# Altium footprint library Generic Footprint.PcbLib: 160 footprints (part 15 of 20) (continued)
## Symbol_FCC-Logo-3x2mm_Silkscreen [mm] (continued)
1(2.184,1.657) 1(2.184,1.661) 1(2.184,1.664) 1(2.188,0.311) 1(2.188,0.705) 1(2.188,0.709) 1(2.188,0.712) 1(2.188,0.716) 1(2.191,0.039) 1(2.191,0.042) 1(2.191,0.709) 1(2.191,1.793) 1(2.191,1.804) 1(2.191,2.062) 1(2.191,2.065) 1(2.195,0.036) 1(2.195,1.396) 1(2.195,1.399) 1(2.195,1.8) 1(2.195,2.069) 1(2.198,0.447) 1(2.198,0.719) 1(2.198,1.389) 1(2.201,0.444) 1(2.201,0.45) 1(2.201,1.654) 1(2.205,1.396) 1(2.205,1.661) 1(2.205,1.797) 1(2.208,0.716) 1(2.208,0.722) 1(2.208,1.385) 1(2.208,1.389) 1(2.208,1.392) 1(2.208,1.797) 1(2.212,0.308) 1(2.212,0.716) 1(2.212,1.79) 1(2.215,0.447) 1(2.215,0.45) 1(2.215,0.454) 1(2.215,0.719) 1(2.215,0.726) 1(2.215,1.382) 1(2.215,1.385) 1(2.215,1.389) 1(2.215,1.654) 1(2.218,0.042) 1(2.218,0.046) 1(2.218,0.457) 1(2.218,1.651) 1(2.218,1.657) 1(2.218,2.059) 1(2.218,2.062) 1(2.218,2.065) 1(2.222,0.039) 1(2.222,0.049) 1(2.222,0.314) 1(2.222,0.719) 1(2.222,0.722) 1(2.222,1.379) 1(2.222,1.385) 1(2.222,1.647) 1(2.222,2.055) 1(2.225,0.049) 1(2.225,0.308) 1(2.225,0.311) 1(2.225,0.729) 1(2.229,0.049) 1(2.229,0.45) 1(2.229,0.454) 1(2.229,0.457) 1(2.229,0.722) 1(2.229,0.729) 1(2.229,1.375) 1(2.229,1.644) 1(2.229,1.651) 1(2.229,1.654) 1(2.229,1.793) 1(2.232,0.457) 1(2.232,0.461) 1(2.232,0.726) 1(2.232,0.733) 1(2.232,1.372) 1(2.232,1.379) 1(2.232,1.787) 1(2.232,1.793) 1(2.235,0.726) 1(2.235,0.729) 1(2.235,0.736) 1(2.235,1.379) 1(2.239,0.049) 1(2.239,0.311) 1(2.239,0.318) 1(2.239,0.454) 1(2.239,0.457) 1(2.239,0.733) 1(2.239,0.739) 1(2.239,1.375) 1(2.239,1.793) 1(2.239,2.062) 1(2.242,0.042) 1(2.242,0.046) 1(2.242,0.314) 1(2.242,0.461) 1(2.242,0.464) 1(2.242,0.733) 1(2.242,0.736) 1(2.242,1.368) 1(2.242,1.372) 1(2.242,1.375) 1(2.242,1.647) 1(2.242,1.79) 1(2.242,1.793) 1(2.242,2.052) 1(2.242,2.055) 1(2.242,2.059) 1(2.246,1.64) 1(2.246,1.644) 1(2.246,1.647) 1(2.246,1.651) 1(2.246,1.783) 1(2.249,0.736) 1(2.249,0.739) 1(2.249,0.743) 1(2.252,0.457) 1(2.252,0.464) 1(2.252,0.739) 1(2.252,1.365) 1(2.252,1.368) 1(2.252,1.372) 1(2.256,0.314) 1(2.256,0.318) 1(2.256,0.325) 1(2.256,0.746) 1(2.256,0.75) 1(2.256,1.637) 1(2.256,1.64) 1(2.256,1.79) 1(2.256,2.059) 1(2.259,0.046) 1(2.259,1.362) 1(2.259,1.365) 1(2.259,1.368) 1(2.259,1.644) 1(2.259,1.78) 1(2.259,1.783) 1(2.259,1.787) 1(2.259,2.052) 1(2.263,0.461) 1(2.263,0.753) 1(2.263,1.355) 1(2.263,1.358) 1(2.263,1.362) 1(2.263,1.365) 1(2.263,2.048) 1(2.266,1.358) 1(2.266,1.634) 1(2.266,1.637) 1(2.266,2.055) 1(2.269,0.318) 1(2.269,0.321) 1(2.269,0.325) 1(2.269,0.328) 1(2.269,0.756) 1(2.269,1.351) 1(2.269,1.358) 1(2.269,1.362) 1(2.273,0.756) 1(2.273,0.76) 1(2.273,1.348) 1(2.273,1.634) 1(2.273,1.64) 1(2.273,1.776) 1(2.273,1.78) 1(2.273,1.783) 1(2.273,1.787) 1(2.276,0.464) 1(2.28,0.049) 1(2.28,0.756) 1(2.28,2.045) 1(2.28,2.048) 1(2.283,0.325) 1(2.283,0.328) 1(2.283,0.331) 1(2.283,0.467) 1(2.283,0.76) 1(2.283,0.767) 1(2.283,1.345) 1(2.283,1.637) 1(2.283,2.045) 1(2.286,0.478) 1(2.286,0.76) 1(2.286,0.763) 1(2.286,0.767) 1(2.286,0.77) 1(2.286,1.338) 1(2.286,1.341) 1(2.286,1.773) 1(2.286,1.776) 1(2.286,1.78) 1(2.29,0.328) 1(2.29,0.471) 1(2.29,0.767) 1(2.29,0.77) 1(2.29,0.773) 1(2.29,1.341) 1(2.29,2.045) 1(2.29,2.052) 1(2.293,0.053) 1(2.293,0.059) 1(2.293,0.335) 1(2.293,0.474) 1(2.293,0.478) 1(2.293,0.481) 1(2.293,0.777) 1(2.293,1.334) 1(2.293,1.338) 1(2.293,2.045) 1(2.297,0.77) 1(2.297,1.341) 1(2.297,1.623) 1(2.297,1.63) 1(2.297,1.634) 1(2.297,1.77) 1(2.297,1.773) 1(2.297,1.776) 1(2.3,0.78) 1(2.3,1.331) 1(2.3,1.334) 1(2.3,1.338) 1(2.303,0.338) 1(2.303,0.478) 1(2.303,0.484) 1(2.303,0.784) 1(2.303,1.328) 1(2.303,1.331) 1(2.303,1.334) 1(2.303,1.62) 1(2.303,1.623) 1(2.303,1.627) 1(2.307,0.059) 1(2.307,0.481) 1(2.307,0.784) 1(2.307,0.787) 1(2.307,1.321) 1(2.307,1.324) 1(2.307,1.328) 1(2.307,1.331) 1(2.307,1.763) 1(2.307,1.766) 1(2.307,1.773) 1(2.31,0.056) 1(2.31,0.063) 1(2.31,0.066) 1(2.31,0.787) 1(2.31,0.79) 1(2.31,1.328) 1(2.31,1.617) 1(2.31,1.62) 1(2.31,2.048) 1(2.314,0.342) 1(2.314,0.481) 1(2.314,0.484) 1(2.314,0.488) 1(2.314,0.784) 1(2.314,0.794) 1(2.314,1.317) 1(2.314,1.613) 1(2.314,1.623) 1(2.317,0.338) 1(2.317,0.488) 1(2.317,0.787) 1(2.317,0.79) 1(2.317,0.794) 1(2.317,0.797) 1(2.317,1.314) 1(2.32,0.059) 1(2.32,0.338) 1(2.32,0.79) 1(2.32,0.797) 1(2.32,0.801) 1(2.32,1.311) 1(2.32,1.314) 1(2.32,1.317) 1(2.32,1.62) 1(2.32,1.759) 1(2.32,2.045) 1(2.324,0.063) 1(2.324,0.066) 1(2.324,0.07) 1(2.324,0.345) 1(2.324,0.484) 1(2.324,0.495) 1(2.324,0.794) 1(2.324,0.797) 1(2.324,0.801) 1(2.324,0.804) 1(2.324,1.307) 1(2.324,1.311) 1(2.324,1.317) 1(2.324,1.61) 1(2.324,1.613) 1(2.324,1.617) 1(2.324,2.035) 1(2.327,0.063) 1(2.327,0.066) 1(2.327,0.342) 1(2.327,0.488) 1(2.327,0.495) 1(2.327,0.807) 1(2.327,1.3) 1(2.327,1.304) 1(2.327,1.311) 1(2.327,1.314) 1(2.327,1.613) 1(2.327,1.756) 1(2.327,1.763) 1(2.327,2.042) 1(2.331,0.066) 1(2.331,0.801) 1(2.331,0.804) 1(2.331,0.807) 1(2.331,0.811) 1(2.331,0.814) 1(2.331,1.304) 1(2.331,1.307) 1(2.331,1.606) 1(2.331,1.61) 1(2.331,1.617) 1(2.331,1.763) 1(2.334,0.063) 1(2.334,0.491) 1(2.334,0.804) 1(2.334,0.807) 1(2.334,0.811) 1(2.334,0.818) 1(2.334,1.297) 1(2.334,1.3) 1(2.334,1.307) 1(2.337,0.063) 1(2.337,0.07) 1(2.337,0.342) 1(2.337,0.345) 1(2.337,0.348) 1(2.337,0.811) 1(2.337,0.814) 1(2.337,0.818) 1(2.337,0.821) 1(2.337,1.287) 1(2.337,1.29) 1(2.337,1.294) 1(2.337,1.3) 1(2.337,1.304) 1(2.337,1.603) 1(2.337,1.753) 1(2.337,1.759) 1(2.337,2.031) 1(2.337,2.035) 1(2.337,2.038) 1(2.341,0.066) 1(2.341,0.073) 1(2.341,0.495) 1(2.341,0.501) 1(2.341,0.814) 1(2.341,0.818) 1(2.341,0.821) 1(2.341,0.824) 1(2.341,1.283) 1(2.341,1.606) 1(2.344,0.345) 1(2.344,0.348) 1(2.344,0.352) 1(2.344,1.603) 1(2.344,1.61) 1(2.344,1.756) 1(2.344,1.759) 1(2.348,0.073) 1(2.348,0.076) 1(2.348,0.498) 1(2.348,0.501) 1(2.348,0.505) 1(2.348,1.28) 1(2.348,1.283) 1(2.348,2.028) 1(2.348,2.031) 1(2.348,2.035) 1(2.351,0.07) 1(2.351,0.348) 1(2.351,0.355) 1(2.351,0.508) 1(2.351,1.606) 1(2.351,1.749) 1(2.354,0.352) 1(2.354,0.355) 1(2.354,0.359) 1(2.354,0.501) 1(2.354,0.508) 1(2.354,1.266) 1(2.354,1.27) 1(2.354,1.283) 1(2.354,1.746) 1(2.354,1.753) 1(2.354,1.756) 1(2.358,0.355) 1(2.358,0.505) 1(2.358,0.512) 1(2.358,1.27) 1(2.358,1.277) 1(2.358,1.603) 1(2.358,1.749) 1(2.361,0.352) 1(2.361,0.362) 1(2.361,1.593) 1(2.361,1.742) 1(2.361,1.746) 1(2.361,1.753) 1(2.365,0.073) 1(2.365,0.076) 1(2.365,0.505) 1(2.365,0.508) 1(2.365,0.512) 1(2.365,0.515) 1(2.365,1.273) 1(2.365,1.589) 1(2.365,1.593) 1(2.365,1.596) 1(2.365,1.6) 1(2.365,1.749) 1(2.365,2.025) 1(2.365,2.028) 1(2.365,2.031) 1(2.368,0.073) 1(2.368,2.021) 1(2.371,0.073) 1(2.371,0.365) 1(2.371,0.515) 1(2.371,0.518) 1(2.371,1.586) 1(2.371,1.589) 1(2.371,1.593) 1(2.371,1.739) 1(2.371,1.742) 1(2.371,1.746) 1(2.375,0.512) 1(2.375,2.021) 1(2.375,2.025) 1(2.375,2.028) 1(2.378,0.362) 1(2.378,0.369) 1(2.378,0.518) 1(2.378,0.522) 1(2.378,1.583) 1(2.378,1.586) 1(2.378,1.589) 1(2.378,1.736) 1(2.378,1.742) 1(2.378,2.018) 1(2.382,0.362) 1(2.382,0.515) 1(2.382,0.522) 1(2.382,1.583) 1(2.382,1.586) 1(2.385,0.076) 1(2.385,0.365) 1(2.385,0.372) 1(2.385,1.576) 1(2.385,2.018) 1(2.385,2.025) 1(2.388,0.08) 1(2.388,0.518) 1(2.388,1.576) 1(2.388,1.583) 1(2.388,1.732) 1(2.392,0.365) 1(2.392,0.369) 1(2.392,0.372) 1(2.392,0.376) 1(2.392,0.522) 1(2.392,0.532) 1(2.392,1.572) 1(2.392,1.729) 1(2.392,2.014) 1(2.395,0.525) 1(2.395,1.579) 1(2.395,2.014) 1(2.395,2.021) 1(2.399,0.083) 1(2.399,0.09) 1(2.399,0.369) 1(2.399,0.376) 1(2.399,0.532) 1(2.399,1.572) 1(2.399,1.725) 1(2.402,0.372) 1(2.402,0.379) 1(2.402,0.529) 1(2.402,0.535) 1(2.402,1.569) 1(2.402,1.576) 1(2.405,0.093) 1(2.405,0.539) 1(2.405,1.566) 1(2.405,1.569) 1(2.405,1.722) 1(2.405,1.729) 1(2.409,0.087) 1(2.409,0.09) 1(2.409,0.376) 1(2.409,0.379) 1(2.409,0.382) 1(2.409,0.532) 1(2.409,0.535) 1(2.409,0.542) 1(2.409,1.566) 1(2.409,1.569) 1(2.409,1.572) 1(2.409,1.725) 1(2.409,1.729) 1(2.409,2.018) 1(2.412,0.535) 1(2.412,0.539) 1(2.412,0.546) 1(2.412,1.559) 1(2.412,1.719) 1(2.416,0.379) 1(2.416,0.382) 1(2.416,0.386) 1(2.416,0.539) 1(2.416,0.542) 1(2.416,0.546) 1(2.416,0.549) 1(2.416,1.722) 1(2.416,1.725) 1(2.416,2.004) 1(2.416,2.008) 1(2.416,2.014) 1(2.419,0.09) 1(2.419,0.093) 1(2.419,0.097) 1(2.419,1.555) 1(2.419,1.559) 1(2.419,1.562) 1(2.419,1.566) 1(2.422,0.1) 1(2.422,0.382) 1(2.422,0.386) 1(2.422,0.389) 1(2.422,0.393) 1(2.422,0.542) 1(2.422,0.549) 1(2.422,1.552) 1(2.422,1.555) 1(2.422,1.712) 1(2.422,1.719) 1(2.422,1.722) 1(2.426,0.093) 1(2.426,0.097) 1(2.426,0.386) 1(2.426,0.546) 1(2.426,0.552) 1(2.426,1.552) 1(2.426,1.559) 1(2.426,2.004) 1(2.426,2.008) 1(2.426,2.011) 1(2.429,0.1) 1(2.429,0.104) 1(2.429,0.552) 1(2.429,1.549) 1(2.429,1.555) 1(2.429,1.708) 1(2.429,1.712) 1(2.429,1.719) 1(2.429,2.001) 1(2.433,0.396) 1(2.433,0.549) 1(2.433,0.556) 1(2.433,1.549) 1(2.433,1.715) 1(2.433,2.008) 1(2.436,0.097) 1(2.436,0.104) 1(2.436,0.399) 1(2.436,0.552) 1(2.436,0.556) 1(2.436,0.559) 1(2.436,0.563) 1(2.436,1.552) 1(2.436,2.001) 1(2.439,0.107) 1(2.439,0.556) 1(2.439,0.559) 1(2.439,0.563) 1(2.439,0.566) 1(2.439,1.549) 1(2.439,1.705) 1(2.439,1.712) 1(2.439,1.997) 1(2.439,2.004) 1(2.443,0.1) 1(2.443,0.396) 1(2.443,0.559) 1(2.443,1.545) 1(2.443,1.702) 1(2.446,0.107) 1(2.446,0.399) 1(2.446,0.403) 1(2.446,0.563) 1(2.446,0.566) 1(2.446,0.569) 1(2.446,1.698) 1(2.446,1.994) 1(2.446,1.997) 1(2.446,2.001) 1(2.45,0.11) 1(2.45,0.396) 1(2.45,0.399) 1(2.45,0.406) 1(2.45,1.532) 1(2.45,1.535) 1(2.45,1.542) 1(2.453,0.403) 1(2.453,0.406) 1(2.453,0.41) 1(2.453,0.566) 1(2.453,0.569) 1(2.453,0.573) 1(2.453,1.528) 1(2.453,1.532) 1(2.453,1.535) 1(2.453,1.538) 1(2.456,0.104) 1(2.456,0.11) 1(2.456,0.569) 1(2.456,0.573) 1(2.456,1.528) 1(2.456,1.535) 1(2.456,1.691) 1(2.456,1.695) 1(2.456,1.698) 1(2.456,1.991) 1(2.456,1.994) 1(2.46,0.403) 1(2.46,0.406) 1(2.46,0.41) 1(2.46,0.413) 1(2.46,0.573) 1(2.46,1.521) 1(2.46,1.532) 1(2.46,1.695) 1(2.46,1.698) 1(2.46,1.997) 1(2.463,0.107) 1(2.463,0.576) 1(2.463,1.528) 1(2.463,1.991) 1(2.467,1.518) 1(2.467,1.688) 1(2.467,1.695) 1(2.47,0.11) 1(2.47,0.41) 1(2.47,0.413) 1(2.47,0.416) 1(2.47,0.42) 1(2.47,0.58) 1(2.47,1.518) 1(2.47,1.521) 1(2.47,1.525) 1(2.47,1.685) 1(2.47,1.688) 1(2.47,1.691) 1(2.47,1.994) 1(2.473,0.114) 1(2.473,0.121) 1(2.473,0.413) 1(2.473,0.416) 1(2.473,0.583) 1(2.473,1.521) 1(2.473,1.691) 1(2.473,1.991) 1(2.477,0.416) 1(2.477,0.423) 1(2.477,0.586) 1(2.477,1.518) 1(2.477,1.681) 1(2.477,1.688) 1(2.48,0.427) 1(2.48,0.597) 1(2.48,1.504) 1(2.48,1.508) 1(2.48,1.678) 1(2.484,0.117) 1(2.484,0.121) 1(2.484,0.124) 1(2.484,0.43) 1(2.484,0.59) 1(2.484,0.593) 1(2.484,0.597) 1(2.484,0.6) 1(2.484,1.501) 1(2.484,1.508) 1(2.484,1.511) 1(2.484,1.515) 1(2.484,1.674) 1(2.484,1.98) 1(2.484,1.987) 1(2.487,0.597) 1(2.487,0.6) 1(2.487,0.603) 1(2.487,1.498) 1(2.487,1.504) 1(2.487,1.508) 1(2.487,1.98) 1(2.49,0.121) 1(2.49,0.124) 1(2.49,0.127) 1(2.49,0.427) 1(2.49,0.433) 1(2.49,0.6) 1(2.49,0.603) 1(2.49,0.607) 1(2.49,1.494) 1(2.49,1.498) 1(2.49,1.501) 1(2.49,1.504) 1(2.49,1.671) 1(2.49,1.977) 1(2.49,1.984) 1(2.494,0.427) 1(2.494,0.43) 1(2.494,0.437) 1(2.494,0.603) 1(2.494,0.607) 1(2.494,0.821) 1(2.494,0.824) 1(2.494,0.828) 1(2.494,1.491) 1(2.494,1.494) 1(2.494,1.501) 1(2.494,1.668) 1(2.497,0.124) 1(2.497,0.127) 1(2.497,0.131) 1(2.497,0.43) 1(2.497,0.433) 1(2.497,1.487) 1(2.497,1.491) 1(2.497,1.498) 1(2.497,1.974) 1(2.497,1.977) 1(2.497,1.98) 1(2.501,0.134) 1(2.501,0.437) 1(2.501,0.44) 1(2.501,0.607) 1(2.501,0.61) 1(2.501,1.487) 1(2.501,1.494) 1(2.501,1.664) 1(2.501,1.97) 1(2.504,0.127) 1(2.504,0.134) 1(2.504,0.433) 1(2.504,0.437) 1(2.504,0.444) 1(2.504,0.614) 1(2.504,0.62) 1(2.504,1.491) 1(2.504,1.661) 1(2.504,1.977) 1(2.507,0.131) 1(2.507,0.138) 1(2.507,0.44) 1(2.507,0.447) 1(2.507,0.617) 1(2.507,0.62) 1(2.507,0.624) 1(2.507,1.477) 1(2.507,1.487) 1(2.507,1.657) 1(2.507,1.661) 1(2.507,1.664) 1(2.507,1.967) 1(2.507,1.97) 1(2.507,1.974) 1(2.511,0.131) 1(2.511,0.44) 1(2.511,0.444) 1(2.511,0.62) 1(2.511,0.624) 1(2.511,0.627) 1(2.511,0.631) 1(2.511,1.474) 1(2.511,1.484) 1(2.511,1.664) 1(2.511,1.974) 1(2.514,0.138) 1(2.514,0.141) 1(2.514,0.45) 1(2.514,0.627) 1(2.514,1.47) 1(2.514,1.477) 1(2.514,1.481) 1(2.514,1.654) 1(2.514,1.657) 1(2.514,1.661) 1(2.514,1.963) 1(2.514,1.967) 1(2.514,1.97) 1(2.518,0.134) 1(2.518,0.141) 1(2.518,0.444) 1(2.518,0.447) 1(2.518,0.624) 1(2.518,0.627) 1(2.518,0.631) 1(2.518,0.634) 1(2.518,0.637) 1(2.518,1.467) 1(2.518,1.474) 1(2.518,1.477) 1(2.518,1.651) 1(2.521,0.447) 1(2.521,0.454) 1(2.521,0.631) 1(2.521,0.634) 1(2.521,1.464) 1(2.521,1.47) 1(2.521,1.474) 1(2.521,1.647) 1(2.521,1.654) 1(2.521,1.657) 1(2.521,1.96) 1(2.521,1.963) 1(2.524,0.457) 1(2.524,0.461) 1(2.524,0.634) 1(2.524,0.637) 1(2.524,0.641) 1(2.524,0.644) 1(2.524,1.464) 1(2.524,1.467) 1(2.524,1.47) 1(2.524,1.644) 1(2.524,1.654) 1(2.524,1.967) 1(2.528,0.138) 1(2.528,0.457) 1(2.528,0.637) 1(2.528,0.641) 1(2.528,0.644) 1(2.528,1.467) 1(2.528,1.96) 1(2.531,0.464) 1(2.531,1.464) 1(2.531,1.64) 1(2.535,0.141) 1(2.535,0.148) 1(2.535,0.151) 1(2.535,0.457) 1(2.535,0.641) 1(2.535,0.644) 1(2.535,0.648) 1(2.535,0.654) 1(2.535,1.46) 1(2.535,1.637) 1(2.535,1.963) 1(2.538,0.467) 1(2.538,0.651) 1(2.538,0.654) 1(2.538,0.658) 1(2.538,0.661) 1(2.538,1.447) 1(2.538,1.453) 1(2.538,1.457) 1(2.538,1.634) 1(2.538,1.64) 1(2.541,0.144) 1(2.541,0.148) 1(2.541,0.151) 1(2.541,0.155) 1(2.541,0.467) 1(2.541,0.471) 1(2.541,0.654) 1(2.541,0.658) 1(2.541,0.665) 1(2.541,0.668) 1(2.541,1.436) 1(2.541,1.44) 1(2.541,1.447) 1(2.541,1.45) 1(2.541,1.637) 1(2.541,1.64) 1(2.541,1.96) 1(2.545,0.148) 1(2.545,0.467) 1(2.545,0.471) 1(2.545,0.474) 1(2.545,0.478) 1(2.545,0.658) 1(2.545,0.661) 1(2.545,0.665) 1(2.545,0.671) 1(2.545,1.44) 1(2.545,1.447) 1(2.545,1.63) 1(2.545,1.95) 1(2.545,1.957) 1(2.548,0.155) 1(2.548,0.471) 1(2.548,0.481) 1(2.548,0.661) 1(2.548,1.433) 1(2.548,1.443) 1(2.548,1.63) 1(2.548,1.637) 1(2.548,1.95) 1(2.552,0.151) 1(2.552,0.158) 1(2.552,0.665) 1(2.552,0.671) 1(2.552,0.675) 1(2.552,1.433) 1(2.552,1.44) 1(2.552,1.623) 1(2.552,1.627) 1(2.552,1.946) 1(2.552,1.953) 1(2.555,0.671) 1(2.555,0.675) 1(2.555,0.678) 1(2.555,0.682) 1(2.555,1.423) 1(2.555,1.433) 1(2.555,1.627) 1(2.555,1.63) 1(2.555,1.943) 1(2.555,1.946) 1(2.558,0.155) 1(2.558,0.158) 1(2.558,0.161) 1(2.558,0.484) 1(2.558,0.675) 1(2.558,0.678) 1(2.558,0.682) 1(2.558,1.423) 1(2.558,1.43) 1(2.558,1.62) 1(2.558,1.623) 1(2.558,1.627) 1(2.558,1.94) 1(2.558,1.943) 1(2.558,1.946) 1(2.558,1.95) 1(2.562,0.488) 1(2.562,0.678) 1(2.562,0.682) 1(2.562,0.685) 1(2.562,0.692) 1(2.562,1.413) 1(2.562,1.419) 1(2.562,1.423) 1(2.562,1.426) 1(2.562,1.613) 1(2.562,1.617) 1(2.562,1.62) 1(2.562,1.623) 1(2.562,1.936) 1(2.565,0.158) 1(2.565,0.161) 1(2.565,0.165) 1(2.565,0.491) 1(2.565,1.409) 1(2.565,1.61) 1(2.565,1.617) 1(2.565,1.62) 1(2.569,0.161) 1(2.569,0.165) 1(2.569,0.488) 1(2.569,0.491) 1(2.569,0.495) 1(2.569,0.688) 1(2.569,0.692) 1(2.569,0.699) 1(2.569,0.702) 1(2.569,1.406) 1(2.569,1.409) 1(2.569,1.413) 1(2.569,1.416) 1(2.569,1.606) 1(2.569,1.613) 1(2.569,1.617) 1(2.569,1.933) 1(2.569,1.94) 1(2.569,1.943) 1(2.572,0.488) 1(2.572,0.491) 1(2.572,0.495) 1(2.572,0.498) 1(2.572,0.692) 1(2.572,0.699) 1(2.572,0.705) 1(2.572,0.709) 1(2.572,1.396) 1(2.572,1.399) 1(2.572,1.402) 1(2.572,1.406) 1(2.572,1.413) 1(2.572,1.603) 1(2.572,1.61) 1(2.572,1.613) 1(2.572,1.936) 1(2.575,0.495) 1(2.575,0.498) 1(2.575,0.501) 1(2.575,0.695) 1(2.575,0.699) 1(2.575,0.702) 1(2.575,0.705) 1(2.575,0.709) 1(2.575,0.712) 1(2.575,1.392) 1(2.575,1.396) 1(2.575,1.399) 1(2.575,1.406) 1(2.575,1.409) 1(2.575,1.606) 1(2.575,1.61) 1(2.575,1.933) 1(2.575,1.94) 1(2.579,0.165) 1(2.579,0.498) 1(2.579,0.505) 1(2.579,0.702) 1(2.579,0.705) 1(2.579,0.709) 1(2.579,0.712) 1(2.579,0.716) 1(2.579,0.719) 1(2.579,1.385) 1(2.579,1.389) 1(2.579,1.396) 1(2.579,1.399) 1(2.579,1.6) 1(2.579,1.603) 1(2.579,1.606) 1(2.579,1.929) 1(2.579,1.936) 1(2.582,0.168) 1(2.582,0.508) 1(2.582,0.712) 1(2.582,1.593) 1(2.582,1.596) 1(2.582,1.6) 1(2.582,1.603) 1(2.582,1.929) 1(2.586,0.175) 1(2.586,0.512) 1(2.586,0.716) 1(2.586,0.719) 1(2.586,0.722) 1(2.586,0.726) 1(2.586,1.379) 1(2.586,1.382) 1(2.586,1.385) 1(2.586,1.589) 1(2.586,1.596) 1(2.586,1.6) 1(2.586,1.933) 1(2.589,0.172) 1(2.589,0.175) 1(2.589,0.178) 1(2.589,0.512) 1(2.589,0.515) 1(2.589,0.716) 1(2.589,0.719) 1(2.589,0.722) 1(2.589,0.726) 1(2.589,0.729) 1(2.589,1.372) 1(2.589,1.375) 1(2.589,1.379) 1(2.589,1.385) 1(2.589,1.593) 1(2.589,1.596) 1(2.592,0.175) 1(2.592,0.178) 1(2.592,0.182) 1(2.592,0.512) 1(2.592,0.515) 1(2.592,0.518) 1(2.592,0.722) 1(2.592,0.726) 1(2.592,1.372) 1(2.592,1.375) 1(2.592,1.586) 1(2.592,1.589) 1(2.592,1.593) 1(2.592,1.929) 1(2.596,0.185) 1(2.596,0.515) 1(2.596,0.518) 1(2.596,0.522) 1(2.596,0.75) 1(2.596,0.753) 1(2.596,1.372) 1(2.596,1.375) 1(2.596,1.379) 1(2.596,1.579) 1(2.596,1.583) 1(2.596,1.586) 1(2.596,1.589) 1(2.596,1.926) 1(2.599,0.522) 1(2.599,0.525) 1(2.599,0.733) 1(2.599,0.739) 1(2.599,1.351) 1(2.599,1.355) 1(2.599,1.365) 1(2.599,1.576) 1(2.599,1.583) 1(2.599,1.586) 1(2.599,1.916) 1(2.603,0.178) 1(2.603,0.182) 1(2.603,0.185) 1(2.603,0.189) 1(2.603,0.518) 1(2.603,0.525) 1(2.603,0.529) 1(2.603,0.736) 1(2.603,0.756) 1(2.603,1.348) 1(2.603,1.358) 1(2.603,1.368) 1(2.603,1.572) 1(2.603,1.579) 1(2.603,1.583) 1(2.603,1.923) 1(2.606,0.182) 1(2.606,0.189) 1(2.606,0.192) 1(2.606,0.522) 1(2.606,0.525) 1(2.606,0.529) 1(2.606,0.532) 1(2.606,0.743) 1(2.606,0.746) 1(2.606,0.76) 1(2.606,0.763) 1(2.606,1.338) 1(2.606,1.341) 1(2.606,1.345) 1(2.606,1.351) 1(2.606,1.362) 1(2.606,1.569) 1(2.606,1.576) 1(2.606,1.579) 1(2.606,1.912) 1(2.606,1.916) 1(2.606,1.919) 1(2.609,0.185) 1(2.609,0.529) 1(2.609,0.532) 1(2.609,0.535) 1(2.609,0.76) 1(2.609,0.763) 1(2.609,0.767) 1(2.609,0.77) 1(2.609,1.334) 1(2.609,1.341) 1(2.609,1.345) 1(2.609,1.351) 1(2.609,1.572) 1(2.609,1.576) 1(2.613,0.192) 1(2.613,0.195) 1(2.613,0.532) 1(2.613,0.539) 1(2.613,0.76) 1(2.613,0.763) 1(2.613,0.77) 1(2.613,0.777) 1(2.613,1.328) 1(2.613,1.334) 1(2.613,1.341) 1(2.613,1.345) 1(2.613,1.566) 1(2.613,1.569) 1(2.613,1.572) 1(2.613,1.909) 1(2.613,1.912) 1(2.613,1.916) 1(2.616,0.189) 1(2.616,0.542) 1(2.616,0.773) 1(2.616,0.777) 1(2.616,1.328) 1(2.616,1.331) 1(2.616,1.559) 1(2.616,1.562) 1(2.616,1.569) 1(2.616,1.906) 1(2.616,1.909) 1(2.616,1.912) 1(2.62,0.195) 1(2.62,0.546) 1(2.62,0.77) 1(2.62,1.334) 1(2.62,1.555) 1(2.62,1.562) 1(2.62,1.902) 1(2.623,0.192) 1(2.623,0.546) 1(2.623,0.549) 1(2.623,0.777) 1(2.623,0.78) 1(2.623,0.801) 1(2.623,0.804) 1(2.623,1.304) 1(2.623,1.321) 1(2.623,1.324) 1(2.623,1.328) 1(2.623,1.552) 1(2.623,1.559) 1(2.623,1.562) 1(2.623,1.906) 1(2.626,0.546) 1(2.626,0.549) 1(2.626,0.552) 1(2.626,0.784) 1(2.626,0.787) 1(2.626,0.79) 1(2.626,0.801) 1(2.626,0.804) 1(2.626,0.811) 1(2.626,1.294) 1(2.626,1.304) 1(2.626,1.317) 1(2.626,1.555) 1(2.626,1.559) 1(2.626,1.902) 1(2.626,1.906) 1(2.626,1.909) 1(2.63,0.195) 1(2.63,0.563) 1(2.63,0.794) 1(2.63,0.797) 1(2.63,0.801) 1(2.63,0.811) 1(2.63,0.814) 1(2.63,0.818) 1(2.63,1.28) 1(2.63,1.283) 1(2.63,1.287) 1(2.63,1.294) 1(2.63,1.304) 1(2.63,1.307) 1(2.63,1.311) 1(2.63,1.314) 1(2.63,1.549) 1(2.63,1.552) 1(2.63,1.555) 1(2.633,0.199) 1(2.633,0.549) 1(2.633,0.556) 1(2.633,0.559) 1(2.633,0.566) 1(2.633,0.804) 1(2.633,0.807) 1(2.633,0.821) 1(2.633,1.29) 1(2.633,1.297) 1(2.633,1.3) 1(2.633,1.545) 1(2.633,1.552) 1(2.637,0.202) 1(2.637,0.209) 1(2.637,0.563) 1(2.637,0.811) 1(2.637,0.818) 1(2.637,0.821) 1(2.637,1.273) 1(2.637,1.277) 1(2.637,1.283) 1(2.637,1.287) 1(2.637,1.294) 1(2.637,1.535) 1(2.637,1.538) 1(2.637,1.542) 1(2.637,1.902) 1(2.64,0.209) 1(2.64,0.212) 1(2.64,0.563) 1(2.64,0.569) 1(2.64,0.818) 1(2.64,0.821) 1(2.64,1.273) 1(2.64,1.277) 1(2.64,1.283) 1(2.64,1.287) 1(2.64,1.538) 1(2.64,1.892) 1(2.64,1.899) 1(2.643,0.206) 1(2.643,0.212) 1(2.643,0.573) 1(2.643,0.828) 1(2.643,1.273) 1(2.643,1.277) 1(2.643,1.532) 1(2.643,1.535) 1(2.643,1.538) 1(2.643,1.889) 1(2.643,1.892) 1(2.647,0.209) 1(2.647,0.216) 1(2.647,0.573) 1(2.647,0.583) 1(2.647,1.266) 1(2.647,1.525) 1(2.647,1.528) 1(2.647,1.535) 1(2.647,1.885) 1(2.647,1.889) 1(2.647,1.895) 1(2.65,0.219) 1(2.65,0.573) 1(2.65,0.586) 1(2.65,1.528) 1(2.65,1.882) 1(2.65,1.885) 1(2.65,1.889) 1(2.65,1.892) 1(2.654,0.212) 1(2.654,0.216) 1(2.654,0.223) 1(2.654,0.576) 1(2.654,0.583) 1(2.654,1.515) 1(2.654,1.518) 1(2.654,1.525) 1(2.654,1.528) 1(2.654,1.878) 1(2.654,1.882) 1(2.654,1.885) 1(2.657,0.216) 1(2.657,0.219) 1(2.657,0.223) 1(2.657,0.226) 1(2.657,0.58) 1(2.657,0.586) 1(2.657,0.59) 1(2.657,1.518) 1(2.657,1.525) 1(2.66,0.219) 1(2.66,0.583) 1(2.66,1.504) 1(2.66,1.508) 1(2.66,1.511) 1(2.66,1.518) 1(2.66,1.521) 1(2.66,1.875) 1(2.66,1.878) 1(2.664,0.226) 1(2.664,0.229) 1(2.664,1.501) 1(2.664,1.882) 1(2.667,0.223) 1(2.667,1.504) 1(2.667,1.872) 1(2.667,1.875) 1(2.667,1.878) 1(2.671,0.226) 1(2.671,0.229) 1(2.674,0.229) 1(2.674,1.872) 1(2.674,1.875) 1(2.677,0.24) 1(2.677,1.861) 1(2.677,1.872) 1(2.681,0.233) 1(2.681,0.24) 1(2.681,0.243) 1(2.681,1.868) 1(2.684,0.236) 1(2.684,1.861) 1(2.688,0.24) 1(2.688,0.243) 1(2.688,0.246) 1(2.688,1.855) 1(2.688,1.858) 1(2.688,1.865) 1(2.691,0.243) 1(2.691,0.246) 1(2.691,0.25) 1(2.691,1.855) 1(2.691,1.858) 1(2.691,1.861) 1(2.694,0.253) 1(2.694,1.858) 1(2.698,0.246) 1(2.698,0.25) 1(2.698,0.253) 1(2.698,1.844) 1(2.698,1.855) 1(2.701,0.25) 1(2.701,1.851) 1(2.705,0.253) 1(2.705,1.841) 1(2.705,1.844) 1(2.708,0.257) 1(2.708,1.848) 1(2.711,0.263) 1(2.711,1.841) 1(2.711,1.844) 1(2.715,0.263) 1(2.715,0.267) 1(2.715,1.841) 1(2.718,0.26) 1(2.718,0.267) 1(2.718,0.27) 1(2.718,1.831) 1(2.722,0.263) 1(2.722,0.27) 1(2.722,0.274) 1(2.722,1.827) 1(2.725,0.267) 1(2.725,0.27) 1(2.725,0.274) 1(2.725,0.277) 1(2.725,0.28) 1(2.725,1.824) 1(2.725,1.831) 1(2.725,1.834) 1(2.725,1.838) 1(2.728,0.274) 1(2.728,0.277) 1(2.728,1.821) 1(2.728,1.827) 1(2.728,1.831) 1(2.732,0.277) 1(2.732,0.28) 1(2.732,1.824) 1(2.732,1.827) 1(2.735,1.821) 1(2.735,1.824) 1(2.739,1.81) 1(2.739,1.821) 1(2.742,0.28) 1(2.742,1.81) 1(2.742,1.817) 1(2.745,0.284) 1(2.745,0.287) 1(2.745,0.294) 1(2.745,0.297) 1(2.745,1.814) 1(2.749,0.294) 1(2.749,1.81) 1(2.752,0.291) 1(2.752,0.297) 1(2.752,0.301) 1(2.756,0.294) 1(2.756,0.301) 1(2.756,0.304) 1(2.756,0.308) 1(2.756,1.797) 1(2.756,1.8) 1(2.759,0.297) 1(2.759,0.304) 1(2.759,0.311) 1(2.759,1.793) 1(2.759,1.8) 1(2.759,1.804) 1(2.759,1.807) 1(2.762,0.301) 1(2.762,0.304) 1(2.762,0.308) 1(2.762,1.79) 1(2.762,1.793) 1(2.762,1.797) 1(2.762,1.8) 1(2.766,0.308) 1(2.766,0.311) 1(2.766,0.314) 1(2.766,1.797) 1(2.769,0.314) 1(2.769,1.79) 1(2.769,1.793) 1(2.773,0.311) 1(2.776,0.314) 1(2.776,0.325) 1(2.776,1.776) 1(2.776,1.78) 1(2.776,1.79) 1(2.779,0.318) 1(2.779,0.321) 1(2.779,0.325) 1(2.779,0.328) 1(2.779,0.331) 1(2.779,1.773) 1(2.779,1.78) 1(2.779,1.783) 1(2.779,1.787) 1(2.783,0.328) 1(2.783,0.335) 1(2.783,1.77) 1(2.783,1.776) 1(2.783,1.78) 1(2.786,0.325) 1(2.786,0.331) 1(2.786,1.773) 1(2.786,1.776) 1(2.79,0.328) 1(2.79,0.335) 1(2.79,0.338) 1(2.79,1.763) 1(2.79,1.766) 1(2.79,1.77) 1(2.79,1.773) 1(2.793,0.331) 1(2.793,0.338) 1(2.793,0.342) 1(2.793,0.345) 1(2.793,1.759) 1(2.793,1.766) 1(2.793,1.77) 1(2.796,0.335) 1(2.796,0.338) 1(2.796,0.342) 1(2.796,1.756) 1(2.796,1.759) 1(2.796,1.763) 1(2.796,1.766) 1(2.8,0.345) 1(2.8,1.756) 1(2.8,1.763) 1(2.803,0.342) 1(2.803,1.759) 1(2.807,0.345) 1(2.807,0.355) 1(2.807,1.746) 1(2.807,1.749) 1(2.81,0.348) 1(2.81,0.355) 1(2.81,0.359) 1(2.81,0.362) 1(2.81,1.739) 1(2.81,1.742) 1(2.81,1.746) 1(2.81,1.749) 1(2.81,1.756) 1(2.813,0.352) 1(2.813,0.359) 1(2.813,0.365) 1(2.813,1.736) 1(2.813,1.739) 1(2.813,1.749) 1(2.813,1.753) 1(2.817,0.355) 1(2.817,0.362) 1(2.817,1.732) 1(2.817,1.746) 1(2.82,0.359) 1(2.82,0.365) 1(2.82,0.369) 1(2.82,1.729) 1(2.82,1.736) 1(2.82,1.739) 1(2.824,0.362) 1(2.824,0.369) 1(2.824,0.372) 1(2.824,1.725) 1(2.824,1.729) 1(2.824,1.732) 1(2.824,1.736) 1(2.827,0.365) 1(2.827,0.372) 1(2.827,1.722) 1(2.827,1.732) 1(2.83,0.369) 1(2.83,0.372) 1(2.83,1.722) 1(2.83,1.725) 1(2.83,1.729) 1(2.834,0.376) 1(2.834,0.379) 1(2.834,0.386) 1(2.834,1.715) 1(2.834,1.725) 1(2.837,0.386) 1(2.837,0.389) 1(2.837,1.712) 1(2.841,0.382) 1(2.841,0.389) 1(2.841,0.393) 1(2.841,1.705) 1(2.841,1.708) 1(2.841,1.715) 1(2.841,1.722) 1(2.844,0.386) 1(2.844,0.389) 1(2.844,0.393) 1(2.844,0.396) 1(2.844,0.399) 1(2.844,1.702) 1(2.844,1.705) 1(2.844,1.715) 1(2.844,1.719) 1(2.847,0.393) 1(2.847,0.396) 1(2.847,0.403) 1(2.847,1.698) 1(2.847,1.702) 1(2.851,0.396) 1(2.851,0.403) 1(2.851,1.695) 1(2.851,1.698) 1(2.851,1.705) 1(2.854,0.403) 1(2.854,1.691) 1(2.854,1.695) 1(2.854,1.702) 1(2.858,0.406) 1(2.858,0.413) 1(2.858,1.691) 1(2.858,1.698) 1(2.861,0.41) 1(2.861,0.413) 1(2.861,0.416) 1(2.861,1.685) 1(2.861,1.691) 1(2.861,1.695) 1(2.864,0.413) 1(2.864,0.416) 1(2.864,1.678) 1(2.864,1.681) 1(2.864,1.685) 1(2.864,1.688) 1(2.868,0.416) 1(2.868,0.42) 1(2.868,0.423) 1(2.868,0.43) 1(2.868,1.678) 1(2.868,1.681) 1(2.868,1.685) 1(2.871,1.671) 1(2.871,1.674) 1(2.871,1.681) 1(2.875,0.427) 1(2.875,0.43) 1(2.875,0.433) 1(2.875,0.437) 1(2.875,1.678) 1(2.878,0.43) 1(2.878,0.433) 1(2.878,0.437) 1(2.878,0.44) 1(2.878,0.444) 1(2.878,1.657) 1(2.878,1.661) 1(2.881,0.433) 1(2.881,0.437) 1(2.881,0.444) 1(2.881,0.447) 1(2.881,1.654) 1(2.881,1.661) 1(2.881,1.668) 1(2.885,0.45) 1(2.885,1.651) 1(2.885,1.654) 1(2.885,1.661) 1(2.885,1.664) 1(2.888,0.444) 1(2.888,0.447) 1(2.888,0.45) 1(2.888,1.651) 1(2.892,0.447) 1(2.892,0.457) 1(2.892,0.461) 1(2.892,1.644) 1(2.892,1.654) 1(2.895,0.45) 1(2.895,0.454) 1(2.895,0.457) 1(2.895,0.461) 1(2.895,0.464) 1(2.895,0.467) 1(2.895,1.634) 1(2.895,1.637) 1(2.895,1.64) 1(2.895,1.644) 1(2.895,1.651) 1(2.898,0.457) 1(2.898,0.464) 1(2.898,0.471) 1(2.898,1.63) 1(2.898,1.634) 1(2.898,1.637) 1(2.898,1.644) 1(2.898,1.647) 1(2.902,0.461) 1(2.902,0.464) 1(2.902,0.467) 1(2.902,0.471) 1(2.902,1.623) 1(2.902,1.627) 1(2.902,1.63) 1(2.905,0.467) 1(2.905,0.474) 1(2.905,0.478) 1(2.905,1.63) 1(2.905,1.634) 1(2.905,1.637) 1(2.909,0.471) 1(2.909,0.481) 1(2.909,0.484) 1(2.909,1.617) 1(2.909,1.62) 1(2.909,1.623) 1(2.909,1.627) 1(2.912,0.481) 1(2.912,0.484) 1(2.912,0.488) 1(2.912,1.61) 1(2.912,1.613) 1(2.912,1.617) 1(2.912,1.623) 1(2.912,1.627) 1(2.915,0.481) 1(2.915,0.484) 1(2.915,0.488) 1(2.915,1.61) 1(2.915,1.613) 1(2.919,0.488) 1(2.919,1.61) 1(2.919,1.613) 1(2.919,1.617) 1(2.922,0.491) 1(2.922,0.505) 1(2.922,0.593) 1(2.922,1.596) 1(2.926,0.495) 1(2.926,0.498) 1(2.926,0.505) 1(2.926,0.586) 1(2.926,0.597) 1(2.926,1.589) 1(2.926,1.593) 1(2.926,1.596) 1(2.926,1.606) 1(2.929,0.501) 1(2.929,0.512) 1(2.929,0.515) 1(2.929,0.518) 1(2.929,0.59) 1(2.929,1.583) 1(2.929,1.586) 1(2.929,1.589) 1(2.929,1.593) 1(2.929,1.596) 1(2.929,1.6) 1(2.929,1.603) 1(2.932,0.505) 1(2.932,0.508) 1(2.932,0.515) 1(2.932,0.522) 1(2.932,0.525) 1(2.932,1.576) 1(2.932,1.579) 1(2.932,1.583) 1(2.932,1.593) 1(2.936,0.525) 1(2.936,0.529) 1(2.936,0.532) 1(2.936,1.569) 1(2.936,1.572) 1(2.936,1.583) 1(2.936,1.589) 1(2.939,0.515) 1(2.939,1.576) 1(2.943,0.525) 1(2.943,0.532) 1(2.943,0.535) 1(2.943,1.566) 1(2.943,1.572) 1(2.943,1.576) 1(2.946,0.532) 1(2.946,0.535) 1(2.946,1.566) 1(2.946,1.572) 1(2.949,0.535) 1(2.949,0.539) 1(2.949,1.559) 1(2.949,1.562) 1(2.949,1.566) 1(2.953,0.542) 1(2.953,0.546) 1(2.953,0.559) 1(2.953,1.538) 1(2.953,1.542) 1(2.953,1.555) 1(2.956,0.549) 1(2.956,0.552) 1(2.956,0.563) 1(2.956,1.552) 1(2.96,0.559) 1(2.96,0.563) 1(2.96,0.566) 1(2.96,0.569) 1(2.96,1.528) 1(2.96,1.532) 1(2.96,1.535) 1(2.96,1.538) 1(2.96,1.545) 1(2.96,1.549) 1(2.963,0.556) 1(2.963,0.559) 1(2.963,0.563) 1(2.963,0.569) 1(2.963,0.573) 1(2.963,0.576) 1(2.963,0.58) 1(2.963,1.521) 1(2.963,1.525) 1(2.963,1.532) 1(2.963,1.538) 1(2.966,0.569) 1(2.966,0.573) 1(2.966,0.576) 1(2.966,0.583) 1(2.966,1.515) 1(2.966,1.518) 1(2.966,1.525) 1(2.966,1.532) 1(2.97,0.573) 1(2.97,0.576) 1(2.97,0.583) 1(2.97,1.511) 1(2.97,1.515) 1(2.97,1.518) 1(2.97,1.525) 1(2.973,1.511) 1(2.977,0.583) 1(2.977,0.586) 1(2.977,0.59) 1(2.977,1.511) 1(2.977,1.515) 1(2.977,1.518) 1(2.98,0.59) 1(2.98,0.593) 1(2.98,1.508) 1(2.983,0.597) 1(2.983,1.501)
Top Overlay:
  drawing of 4310 lines, arcs and shapes, not listed